# Altium footprint library CUSTOM PCB.PcbLib: 404 footprints (part 21 of 26)
Each footprint in its own frame and in the unit in brackets; x right, y up, seen from the top. Pads: shape width x height; smd on the part's side, far side on the other; paste and mask are expansions set on the pad; w line width, h text height; cw(c..) or ccw(c..) is an arc to the next point about the centre after c.
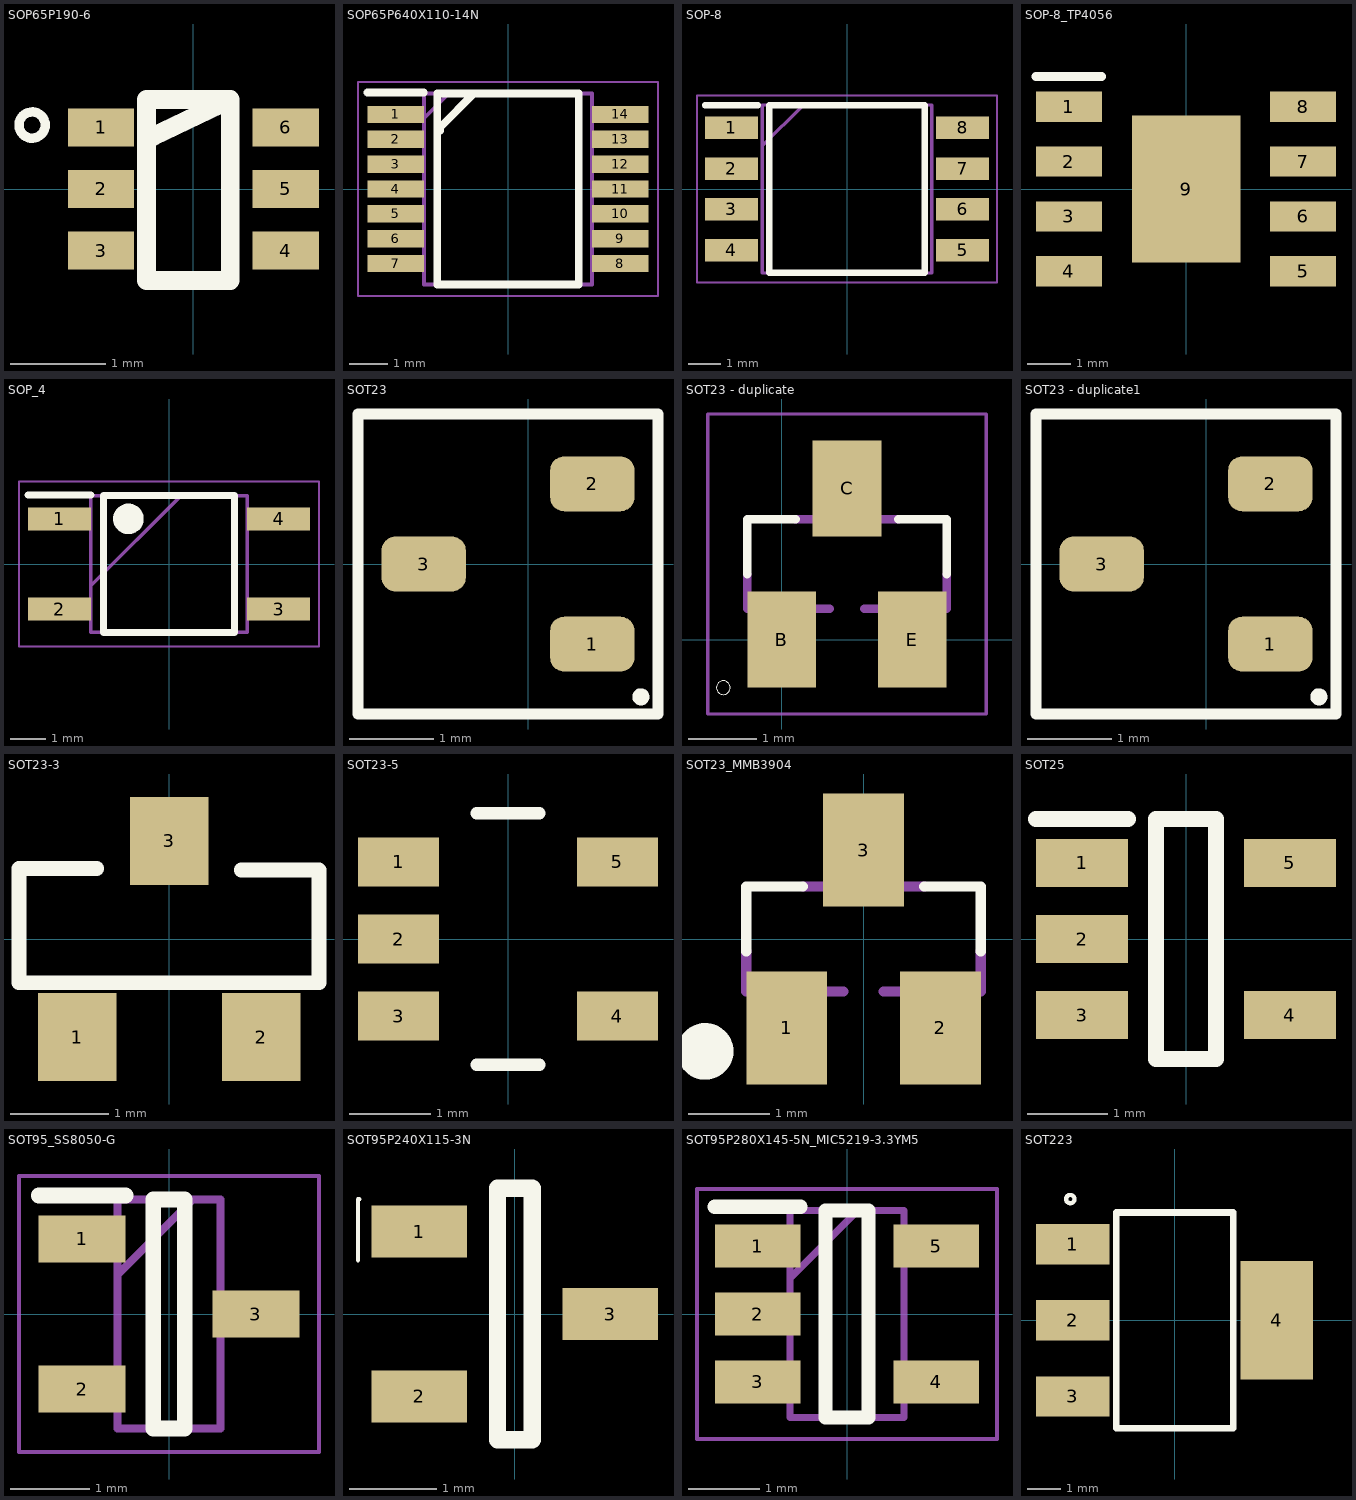
[diagram p20: the footprints below, top view; thin cyan lines are the x and y axes]

## SOP65P190-6 [mm]
pads (6):
  rect 0.7x0.4 smd: 1(-0.975,0.65) 2(-0.975,0) 3(-0.975,-0.65) 4(0.975,-0.65) 5(0.975,0) 6(0.975,0.65)
Top Overlay:
  circle w0.1: c-1.702,0.675 r0.138
  lines w0.2: -0.427,0.555 0.388,0.946 ; 0.388,0.946 -0.494,0.946 -0.494,-0.954 -0.494,-0.967 0.388,-0.967 0.388,0.946
3D body "sot363.x_t": height 0.9, standoff -0.1, extent -1.15,-1.05 1.15,1.05

## SOP65P640X110-14N [mm]
pads (14):
  rect 1.475x0.45 smd: 1(-2.938,1.95) 2(-2.938,1.3) 3(-2.938,0.65) 4(-2.938,0) 5(-2.938,-0.65) 6(-2.938,-1.3) 7(-2.938,-1.95) 8(2.938,-1.95) 9(2.938,-1.3) 10(2.938,-0.65) 11(2.938,0) 12(2.938,0.65) 13(2.938,1.3) 14(2.938,1.95)
Top Overlay:
  lines w0.2: -3.675,2.525 -2.2,2.525 ; -1.778,1.524 -1.778,1.611 -0.889,2.5 ; -1.85,-2.5 1.85,-2.5 1.85,2.5 -1.85,2.5 -1.85,-2.5
Mechanical 15:
  lines w0.1: -2.2,1.85 -1.55,2.5 ; -2.2,-2.5 2.2,-2.5 2.2,2.5 -2.2,2.5 -2.2,-2.5
Mechanical 20:
  lines w0.05: -3.925,-2.8 3.925,-2.8 3.925,2.8 -3.925,2.8 -3.925,-2.8
3D body "74ABT125PW,112.stp": height 1.1, standoff 0, extent -3.2,-2.5 3.2,2.5

## SOP-8 [mm]
pads (8):
  rect 1.65x0.7 smd: 1(-3.6,1.905) 2(-3.6,0.635) 3(-3.6,-0.635) 4(-3.6,-1.905) 5(3.6,-1.905) 6(3.6,-0.635) 7(3.6,0.635) 8(3.6,1.905)
Top Overlay:
  lines w0.2: -4.425,2.605 -2.775,2.605 ; -2.425,-2.615 2.425,-2.615 2.425,2.615 -2.425,2.615 -2.425,-2.615
Mechanical 13:
  lines w0.1: -2.64,1.345 -1.37,2.615 ; -2.64,-2.615 2.64,-2.615 2.64,2.615 -2.64,2.615 -2.64,-2.615
Mechanical 15:
  lines w0.05: -4.675,-2.915 4.675,-2.915 4.675,2.915 -4.675,2.915 -4.675,-2.915
3D body "MX25L3233FM2I-08G.stp": height 2.16, standoff 0, extent -3.95,-2.615 3.95,2.615

## SOP-8_TP4056 [mm] "BAT charging TP4056"
pads (9):
  rect 1.525x0.7 smd: 1(-2.712,1.905) 2(-2.712,0.635) 3(-2.712,-0.635) 4(-2.712,-1.905) 5(2.712,-1.905) 6(2.712,-0.635) 7(2.712,0.635) 8(2.712,1.905)
  rect 2.513x3.402 smd: 9(0,0)
Top Overlay:
  lines w0.2: -3.475,2.605 -1.95,2.605
3D body "TP4056.stp": height 1.75, standoff 0, extent -3,-2.45 3,2.45

## SOP_4 [mm] "opto-coupler"
pads (4):
  rect 1.775x0.65 smd: 1(-3.088,1.27) 2(-3.088,-1.27) 3(3.088,-1.27) 4(3.088,1.27)
Top Overlay:
  circle w0.5: c-1.143,1.27 r0.18
  lines w0.2: -3.975,1.945 -2.2,1.945 ; -1.85,-1.925 1.85,-1.925 1.85,1.925 -1.85,1.925 -1.85,-1.925
Mechanical 15:
  lines w0.1: -2.2,-0.615 0.34,1.925 ; -2.2,-1.925 2.2,-1.925 2.2,1.925 -2.2,1.925 -2.2,-1.925
Mechanical 20:
  lines w0.05: -4.225,-2.325 4.225,-2.325 4.225,2.325 -4.225,2.325 -4.225,-2.325
3D body "VOM617A-2X001T.stp": height 2.4, standoff 0, extent -3.375,-1.925 3.375,1.925

## SOT23 [mm] "SOT-23; 3 Leads; Body 3.0 x 2.6 mm Pitch 0.95mm"
pads (3):
  rrect50% 1x0.65 smd: 1(0.762,-0.95) 2(0.762,0.95) 3(-1.238,0)
Top Overlay:
  circle w0.102: c1.337,-1.575 r0.051
  lines w0.127: -2.016,-1.778 -2.016,1.778 1.54,1.778 1.54,-1.778 -2.016,-1.778
3D body "SOT-23 3.STEP": height 1, standoff -0.02, extent -1.483,-1.46 0.993,1.46

## SOT23 - duplicate [mm] "PNP Transistor Pack"
pads (3):
  rect 1x1.4 smd: B(0,0) C(0.95,2.2) E(1.9,0)
Top Overlay:
  circle w0: c-0.85,-0.7 r0.1
  lines w0.127: -0.5,0.95 -0.5,1.75 0.2,1.75 ; 1.7,1.75 2.4,1.75 2.4,0.95
Mechanical 1:
  region: 0.721,2.395 1.179,2.395 1.179,1.812 0.721,1.812
  region: 1.663,0.389 2.118,0.389 2.118,-0.199 1.663,-0.199
  region: -0.219,0.389 0.239,0.389 0.239,-0.196 -0.219,-0.196
  lines w0.127: -0.5,0.95 -0.5,0.45 0.7,0.45 ; 0.2,1.75 1.7,1.75 ; 1.2,0.45 2.4,0.45 2.4,0.95
Mechanical 4:
  lines w0.051: -1.073,-1.083 2.973,-1.083 2.973,3.283 -1.073,3.283 -1.073,-1.083
3D body "BSS138_D87Z--3DModel-STEP-56544.STEP": height 1.11, standoff -0.09, extent -0.507,-0.247 2.413,2.153
3D body: height 0.25, standoff 0, extent 0,0.889 0,0.889

## SOT23 - duplicate1 [mm] "SOT-23; 3 Leads; Body 3.0 x 2.6 mm Pitch 0.95mm"
pads (3):
  rrect50% 1x0.65 smd: 1(0.762,-0.95) 2(0.762,0.95) 3(-1.238,0)
Top Overlay:
  circle w0.102: c1.337,-1.575 r0.051
  lines w0.127: -2.016,-1.778 -2.016,1.778 1.54,1.778 1.54,-1.778 -2.016,-1.778
3D body "SOT-23 3.STEP": height 1, standoff -0.02, extent -1.483,-1.46 0.993,1.46

## SOT23-3 [mm]
pads (3):
  rect 0.8x0.9 smd: 1(-0.94,-1.003) 2(0.94,-1.003) 3(0,1.003)
Top Overlay:
  lines w0.15: -0.74,0.72 -1.535,0.72 -1.535,0 -1.535,-0.447 1.53,-0.447 1.53,0.705 0.735,0.705
3D body "SOT23-3.stp": height 1.1, standoff -0.08, extent -1.5,-1.418 1.5,1.418

## SOT23-5 [mm]
pads (5):
  rect 1x0.6 smd: 1(-1.35,0.95) 2(-1.35,0) 3(-1.35,-0.95) 4(1.35,-0.95) 5(1.35,0.95)
Top Overlay:
  lines w0.152: -0.389,-1.549 0.389,-1.549 ; -0.389,1.549 0.389,1.549
3D body "User Library-sot235.x_t": height 0.9, standoff -0.1, extent -1.17,-1.46 1.17,1.46
3D body "User Library-sot235.x_t": height 0.95, standoff -0.05, extent -1.444,-0.948 1.476,1.392

## SOT23_MMB3904 [mm]
pads (3):
  rect 1x1.4 smd: 1(-0.95,-1.1) 2(0.95,-1.1) 3(0,1.1)
Top Overlay:
  circle w0.5: c-1.96,-1.39 r0.1
  lines w0.127: -1.45,-0.15 -1.45,0.65 -0.75,0.65 ; 0.75,0.65 1.45,0.65 1.45,-0.15
Mechanical 4:
  region: -1.171,-0.711 -0.711,-0.711 -0.711,-1.298 -1.171,-1.298
  region: 0.712,-0.711 1.168,-0.711 1.168,-1.296 0.712,-1.296
  region: -0.229,1.295 0.229,1.295 0.229,0.711 -0.229,0.711
  region: -1.171,-0.711 -0.711,-0.711 -0.711,-1.298 -1.171,-1.298
  region: 0.712,-0.711 1.168,-0.711 1.168,-1.296 0.712,-1.296
  region: -0.229,1.295 0.229,1.295 0.229,0.711 -0.229,0.711
  lines w0.127: -1.45,-0.65 -0.25,-0.65 -1.45,-0.65 ; -1.45,-0.65 -1.45,-0.15 -1.45,-0.65 ; 1.45,-0.65 1.45,-0.15 1.45,-0.65 ; 1.45,-0.65 0.25,-0.65 1.45,-0.65 ; -0.75,0.65 0.75,0.65 -0.75,0.65
3D body "SOT23_MMBT3904.STEP": height 1.15, standoff -0.05, extent -1.48,-1.18 1.44,1.22

## SOT25 [mm]
pads (5):
  rect 1.15x0.6 smd: 1(-1.3,0.95) 2(-1.3,0) 3(-1.3,-0.95) 4(1.3,-0.95) 5(1.3,0.95)
Top Overlay:
  lines w0.2: -1.875,1.5 -0.725,1.5 ; -0.375,-1.5 0.375,-1.5 0.375,1.5 -0.375,1.5 -0.375,-1.5
3D body "AP22802AW5-7.stp": height 1.3, standoff 0, extent -1.45,-1.5 1.4,1.5

## SOT95_SS8050-G [mm]
pads (3):
  rect 1.1x0.6 smd: 1(-1.1,0.95) 2(-1.1,-0.95) 3(1.1,0)
Top Overlay:
  lines w0.2: -1.65,1.5 -0.55,1.5 ; -0.2,-1.45 -0.2,1.45 0.2,1.45 0.2,-1.45 -0.2,-1.45
Mechanical 15:
  lines w0.1: -0.65,0.5 0.3,1.45 ; -0.65,-1.45 -0.65,1.45 0.65,1.45 0.65,-1.45 -0.65,-1.45
Mechanical 20:
  lines w0.05: -1.9,-1.75 -1.9,1.75 1.9,1.75 1.9,-1.75 -1.9,-1.75
3D body "SS8050-G.stp": height 1.15, standoff 0, extent -1.34,-1.45 1.06,1.45

## SOT95P240X115-3N [mm]
pads (3):
  rect 1.1x0.6 smd: 1(-1.1,0.95) 2(-1.1,-0.95) 3(1.1,0)
Top Overlay:
  lines w0.05: -1.807,0.618 -1.807,1.323 -1.79,1.323
  lines w0.2: -0.2,-1.45 -0.2,1.45 0.2,1.45 0.2,-1.45 -0.2,-1.45
3D body "SOT23-3.stp": height 1.1, standoff -0.08, extent -1.418,-1.5 1.418,1.5

## SOT95P280X145-5N_MIC5219-3.3YM5 [mm]
pads (5):
  rect 1.2x0.6 smd: 1(-1.25,0.95) 2(-1.25,0) 3(-1.25,-0.95) 4(1.25,-0.95) 5(1.25,0.95)
Top Overlay:
  lines w0.2: -1.85,1.5 -0.65,1.5 ; -0.3,-1.45 0.3,-1.45 0.3,1.45 -0.3,1.45 -0.3,-1.45
Mechanical 15:
  lines w0.1: -0.8,0.5 0.15,1.45 ; -0.8,-1.45 0.8,-1.45 0.8,1.45 -0.8,1.45 -0.8,-1.45
Mechanical 20:
  lines w0.05: -2.1,-1.75 2.1,-1.75 2.1,1.75 -2.1,1.75 -2.1,-1.75
3D body "MIC5219-3.3YM5_TR.stp": height 1.45, standoff 0, extent -1.547,-1.445 1.253,1.455

## SOT223 [mil]
pads (4):
  rect 88x48 smd: 1(-122,91) 2(-122,0) 3(-122,-91)
  rect 86.61x141.73 smd: 4(122.01,0)
Top Overlay:
  circle w5: c-125,145 r5
  lines w8: -70,-129 -70,129 70,129 70,-129 -70,-129
3D body "SOT-223.STEP": height 63.18, standoff -3.92, extent -151,-127.56 120.3,128.35